# Altium footprint library Selex_PCBLib.PcbLib: 388 footprints (part 24 of 25)
Each footprint in its own frame and in the unit in brackets; x right, y up, seen from the top. Pads: shape width x height; smd on the part's side, far side on the other; paste and mask are expansions set on the pad; w line width, h text height; cw(c..) or ccw(c..) is an arc to the next point about the centre after c.
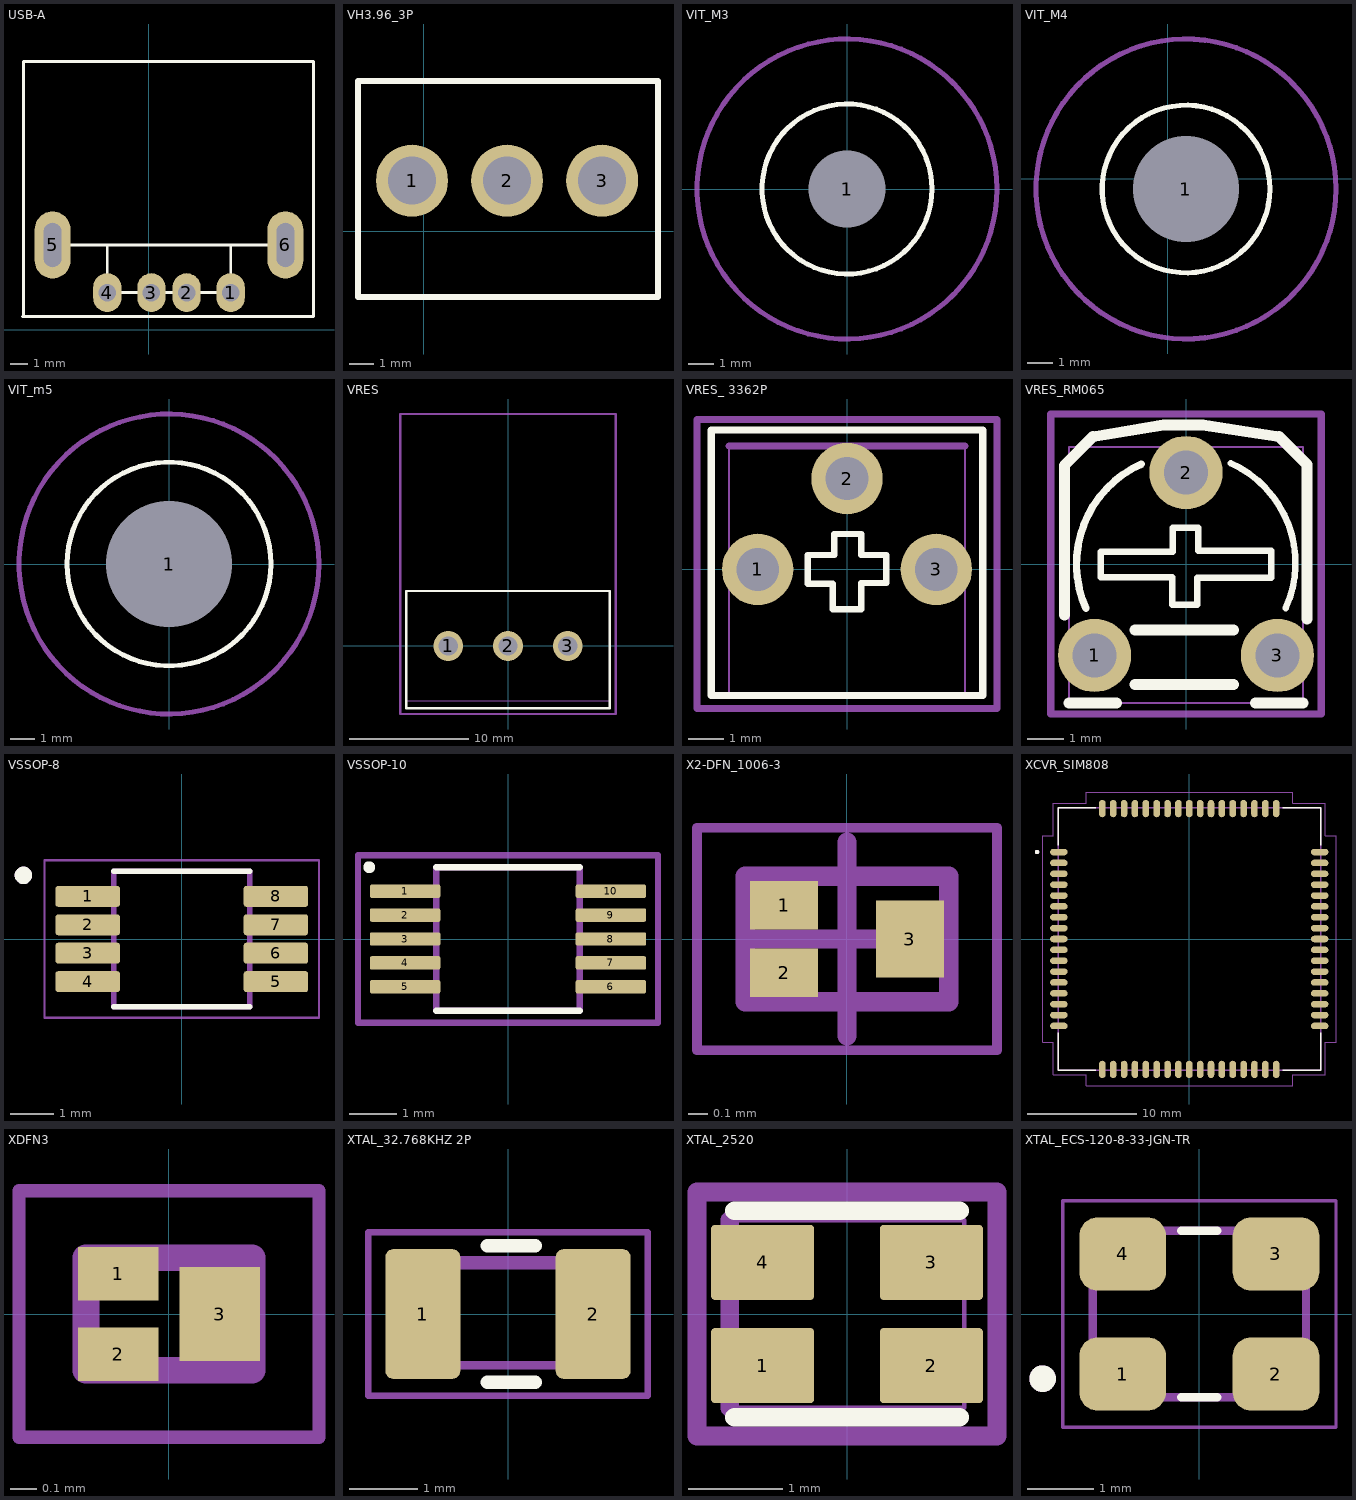
[diagram p23: the footprints below, top view; thin cyan lines are the x and y axes]

## USB-A [mm]
pads (6):
  oval 1.6x2.2 hole 1: 1(4.65,2.1) 2(2.15,2.1) 3(0.15,2.1) 4(-2.35,2.1)
  oval 2.032x3.81 hole 1 slot 2.5 at 90 deg: 5(-5.45,4.8) 6(7.75,4.8)
Top Overlay:
  lines w0.167: -5.45,4.8 -2.35,4.8 ; 4.65,4.8 4.65,2.1 2.15,2.1 0.15,2.1 -2.35,2.1 -2.35,4.8 ; 7.75,4.8 -2.35,4.8 ; -7.15,0.75 -7.1,0.8 -7.1,15.2 9.35,15.2 9.35,0.75 -7.15,0.75
3D body "72w2538_292303-4.stp": height 7.62, standoff -3.65, extent -6.967,1.1 9.267,15.1

## VH3.96_3P [mm]
pads (3):
  round 3 hole 2 mask+0.05: 1(-0.5,2.1) 2(3.46,2.1) 3(7.42,2.1)
Top Overlay:
  lines w0.254: -2.75,-2.75 5.7,-2.75 9.75,-2.75 9.75,6.25 -2.75,6.25 -2.75,-2.75

## VIT_M3 [mm]
pads (1):
  round 3 hole 3.1: 1(0,0)
Top Overlay:
  circle w0.2: c0,0 r3.401
Mechanical 15:
  circle w0.2: c0,0 r6
3D body "M3x10 Screw Self-Tapping Tribulor Button Head.STEP": height 2.5, standoff -9, extent -3.45,-3.45 3.45,3.45

## VIT_M4 [mm]
pads (1):
  round 4 hole 4.1: 1(0.7,-0.4)
Top Overlay:
  circle w0.2: c0.7,-0.4 r3.256
Mechanical 15:
  circle w0.2: c0.7,-0.4 r5.824
3D body "M4 CUP HEAD SCREW.STEP": height 6, standoff -8, extent -2.723,-3.823 4.123,3.023

## VIT_m5 [mm]
pads (1):
  round 5 hole 5.1: 1(0,0)
Top Overlay:
  circle w0.2: c0,0 r4.119
Mechanical 15:
  circle w0.2: c0,0 r6.067
3D body "Torx T25 Conical Head M5x10.STEP": height 5.5, standoff -10, extent -4.185,-4.185 4.185,4.185

## VRES [mm]
pads (3):
  round 2.5 hole 1.6 mask+0.1: 1(-5,-0.01) 2(0,-0.01) 3(5,-0.01)
Top Overlay:
  lines w0.2: -8.5,-5.21 -8.5,4.59 4.25,4.59 8.5,4.59 8.5,-5.21 -8.5,-5.21
Mechanical 1:
  lines w0.05: -8.5,4.59 -8.5,-4.61 8.5,-4.61 8.5,4.59
  lines w0.2: -8.5,4.59 8.5,4.59
Mechanical 15:
  lines w0.2: -9,-5.7 -9,19.4 9,19.4 9,-5.7 -8.3,-5.7 -9,-5.7
3D body "VR.step": height 21.08, standoff -3.86, extent -8.342,-5.24 8.422,18.89

## VRES_ 3362P [mm]
pads (3):
  round 2 hole 1.2 mask+0.1: 1(-2.5,0) 2(0,2.54) 3(2.5,0)
Top Overlay:
  lines w0.178: -1.1,-0.4 -1.1,0.4 -0.356,0.4 -0.356,0.991 0.4,0.991 0.4,0.4 1.1,0.4 1.1,-0.381 0.4,-0.381 0.4,-1.118 -0.4,-1.118 -0.4,-0.4 -1.1,-0.4
  lines w0.2: -3.8,-3.53 3.8,-3.53 3.8,3.9 -3.8,3.9 -3.8,-3.53
Mechanical 1:
  lines w0.05: -3.3,3.45 -3.3,-3.53 -0.23,-3.53 3.3,-3.53 3.3,3.45
  lines w0.2: -3.3,3.45 3.3,3.45
Mechanical 15:
  lines w0.2: -4.2,-3.9 4.2,-3.9 4.2,4.2 -4.2,4.2 -4.2,-3.9
3D body "User Library-Bourns 3362P.step": height 4.7, standoff -5.47, extent -3.3,-3.754 3.3,3.3

## VRES_RM065 [mm]
pads (3):
  round 2 hole 1.2 mask+0.1: 1(-2.5,-2.5) 2(0,2.5) 3(2.5,-2.5)
Top Overlay:
  lines w0.178: -2.337,0.33 -2.337,-0.356 -0.381,-0.356 -0.381,-1.118 0.305,-1.118 0.305,-0.381 2.337,-0.381 2.337,0.356 0.33,0.356 0.33,0.991 -0.356,0.991 -0.356,0.33 -2.311,0.33 ; 1.225,2.755 cw(c0,0.025) 2.725,-1.211
  lines w0.2: -2.734,-1.215 cw(c0,0) -1.215,2.734
  lines w0.3: -3.327,-1.4 -3.327,2.692 -2.54,3.48 -0.619,3.8 0.459,3.8 2.54,3.48 3.302,2.718 3.302,-1.5 ; -3.195,-3.8 -1.9,-3.8 ; -1.4,-3.3 1.3,-3.3 ; -1.4,-1.8 1.3,-1.8 ; 1.9,-3.8 3.195,-3.8
Mechanical 1:
  lines w0.05: -3.2,-3.8 -3.2,0 -3.2,3.2 3.2,3.2 3.2,0 3.2,-3.8 -3.2,-3.8
Mechanical 15:
  lines w0.2: -3.7,-4.1 3.7,-4.1 3.7,4.1 -3.7,4.1 -3.7,-4.1
3D body "Poti_10kohm.stp": height 9.44, standoff -2.39, extent -3.2,-3.333 3.6,3.55

## VSSOP-8 [mm]
pads (8):
  rrect25% 1.47x0.48 smd: 1(-2.15,0.975) 2(-2.15,0.325) 3(-2.15,-0.325) 4(-2.15,-0.975) 5(2.15,-0.975) 6(2.15,-0.325) 7(2.15,0.325) 8(2.15,0.975)
Top Overlay:
  circle w0.2: c-3.62,1.455 r0.1
  lines w0.127: -1.55,-1.55 1.55,-1.55 ; -1.55,1.55 1.55,1.55
Mechanical 13:
  circle w0.2: c-3.62,1.455 r0.1
  lines w0.127: -1.55,-1.55 1.55,-1.55 1.55,1.55 -1.55,1.55 -1.55,-1.55
Mechanical 15:
  lines w0.05: -3.135,-1.8 3.135,-1.8 3.135,1.8 -3.135,1.8 -3.135,-1.8

## VSSOP-10 [mm]
pads (10):
  rrect25% 1.47x0.28 smd: 1(-2.15,1) 2(-2.15,0.5) 3(-2.15,0) 4(-2.15,-0.5) 5(-2.15,-1) 6(2.15,-1) 7(2.15,-0.5) 8(2.15,0) 9(2.15,0.5) 10(2.15,1)
Top Overlay:
  circle w0.15: c-2.9,1.5 r0.05
  lines w0.127: -1.5,-1.5 1.5,-1.5 ; -1.5,1.5 1.5,1.5
Mechanical 13:
  lines w0.127: -1.5,-1.5 1.5,-1.5 1.5,1.5 -1.5,1.5 -1.5,-1.5
Mechanical 15:
  lines w0.127: -3.135,-1.75 3.135,-1.75 3.135,1.75 -3.135,1.75 -3.135,-1.75

## X2-DFN_1006-3 [mm]
pads (3):
  rect 0.35x0.25 smd: 1(-0.325,0.175) 2(-0.325,-0.175)
  rect 0.35x0.4 smd: 3(0.325,0)
Mechanical 13:
  lines w0.1: -0.525,-0.325 -0.525,0.325 0.525,0.325 0.525,-0.325 -0.525,-0.325
Mechanical 15:
  lines w0.05: -0.775,-0.575 -0.775,0.575 0.775,0.575 0.775,-0.575 -0.775,-0.575
  lines w0.1: -0.5,0 0.5,0 ; 0,-0.5 0,0.5
3D body: height 0.4, standoff 0, extent -0.525,-0.325 0.525,0.325

## XCVR_SIM808 [mm]
pads (68):
  oval 1.6x0.6 smd: 1(-12,8) 2(-12,7) 3(-12,6) 4(-12,5) 5(-12,4) 6(-12,3) 7(-12,2) 8(-12,1) 9(-12,0) 10(-12,-1) 11(-12,-2) 12(-12,-3) 13(-12,-4) 14(-12,-5) 15(-12,-6) 16(-12,-7) 17(-12,-8) 35(12,-8) 36(12,-7) 37(12,-6) 38(12,-5) 39(12,-4) 40(12,-3) 41(12,-2) 42(12,-1) 43(12,0) 44(12,1) 45(12,2) 46(12,3) 47(12,4) 48(12,5) 49(12,6) 50(12,7) 51(12,8)
  oval 0.6x1.6 smd: 18(-8,-12) 19(-7,-12) 20(-6,-12) 21(-5,-12) 22(-4,-12) 23(-3,-12) 24(-2,-12) 25(-1,-12) 26(0,-12) 27(1,-12) 28(2,-12) 29(3,-12) 30(4,-12) 31(5,-12) 32(6,-12) 33(7,-12) 34(8,-12) 52(8,12) 53(7,12) 54(6,12) 55(5,12) 56(4,12) 57(3,12) 58(2,12) 59(1,12) 60(0,12) 61(-1,12) 62(-2,12) 63(-3,12) 64(-4,12) 65(-5,12) 66(-6,12) 67(-7,12) 68(-8,12)
Top Overlay:
  circle w0.2: c-14,8 r0.1
  lines w0.127: -12.075,-8.62 -12.075,-12.075 -8.62,-12.075 ; -12.075,8.62 -12.075,12.075 -8.62,12.075 ; 8.62,-12.075 12.075,-12.075 12.075,-8.62 ; 8.62,12.075 12.075,12.075 12.075,8.62
Mechanical 13:
  circle w0.2: c-14,8 r0.1
  lines w0.127: -12.075,-12.075 -12.075,12.075 12.075,12.075 12.075,-12.075 -12.075,-12.075
Mechanical 15:
  lines w0.05: -13.5,-9.5 -13.5,9.5 -12.5,9.5 -12.5,12.5 -9.5,12.5 -9.5,13.5 9.5,13.5 9.5,12.5 12.5,12.5 12.5,9.5 13.5,9.5 13.5,-9.5 12.5,-9.5 12.5,-12.5 9.5,-12.5 9.5,-13.5 -9.5,-13.5 -9.5,-12.5 -12.5,-12.5 -12.5,-9.5 -13.5,-9.5

## XDFN3 [mm] "XDFN3_0.42x0.62"
pads (3):
  rect 0.3x0.2 smd: 1(-0.19,0.15) 2(-0.19,-0.15)
  rect 0.3x0.35 smd: 3(0.19,0)
Mechanical 13:
  lines w0.1: -0.31,-0.21 -0.31,0.21 0.31,0.21 0.31,-0.21 -0.31,-0.21
Mechanical 15:
  lines w0.05: -0.56,-0.46 -0.56,0.46 0.56,0.46 0.56,-0.46 -0.56,-0.46
3D body: height 0.2, standoff 0, extent -0.31,-0.21 0.31,0.21

## XTAL_32.768KHZ 2P [mm]
pads (2):
  rrect20% 1.1x1.9 smd: 1(-1.25,0) 2(1.25,0)
Top Overlay:
  lines w0.2: -0.3,-1 0.4,-1 ; -0.3,1 0.4,1
Mechanical 13:
  lines w0.127: -1.6,0.75 -1.6,-0.75 1.6,-0.75 1.6,0.75
  lines w0.2: -1.6,0.75 1.6,0.75
Mechanical 15:
  lines w0.1: -2.05,-1.2 2.05,-1.2 2.05,1.2 -2.05,1.2 -2.05,-1.2
3D body "ECS-.327-12.5-34B-TR.STEP": height 0.9, standoff 0, extent -1.6,-0.75 1.6,0.75

## XTAL_2520 [mm]
pads (4):
  rrect10% 1.1x0.8 smd mask+0.05: 1(-0.9,-0.55) 2(0.9,-0.55) 3(0.9,0.55) 4(-0.9,0.55)
Top Overlay:
  lines w0.2: -1.2,-1.1 1.2,-1.1 ; -1.2,1.1 1.2,1.1
Mechanical 1:
  lines w0.05: -1.25,-1 1.25,-1 1.25,1 -1.25,1
  lines w0.2: -1.25,-1 -1.25,1
Mechanical 15:
  lines w0.2: -1.6,-1.3 1.6,-1.3 1.6,1.3 -1.6,1.3 -1.6,-1.3

## XTAL_ECS-120-8-33-JGN-TR [mm]
pads (4):
  rrect50% 1.3x1.1 smd mask+0.07: 1(-1.15,-0.9) 2(1.15,-0.9) 3(1.15,0.9) 4(-1.15,0.9)
Top Overlay:
  circle w0.2: c-2.35,-0.97 r0.1
  lines w0.127: -0.27,-1.25 0.27,-1.25 ; -0.27,1.25 0.27,1.25
Mechanical 13:
  circle w0.2: c-2.35,-0.97 r0.1
  lines w0.127: -1.6,-1.25 1.6,-1.25 1.6,1.25 -1.6,1.25 -1.6,-1.25
Mechanical 15:
  lines w0.05: -2.05,-1.7 2.05,-1.7 2.05,1.7 -2.05,1.7 -2.05,-1.7
3D body "ECS-120-8-33-JGN-TR.STEP": height 0.8, standoff 0, extent -1.6,-1.25 1.6,1.25